# Altium footprint library Molex FFC - FPC Connectors (Through-Hole).PcbLib: 219 footprints (part 12 of 14)
Each footprint in its own frame and in the unit in brackets; x right, y up, seen from the top. Pads: shape width x height; smd on the part's side, far side on the other; paste and mask are expansions set on the pad; w line width, h text height; cw(c..) or ccw(c..) is an arc to the next point about the centre after c.
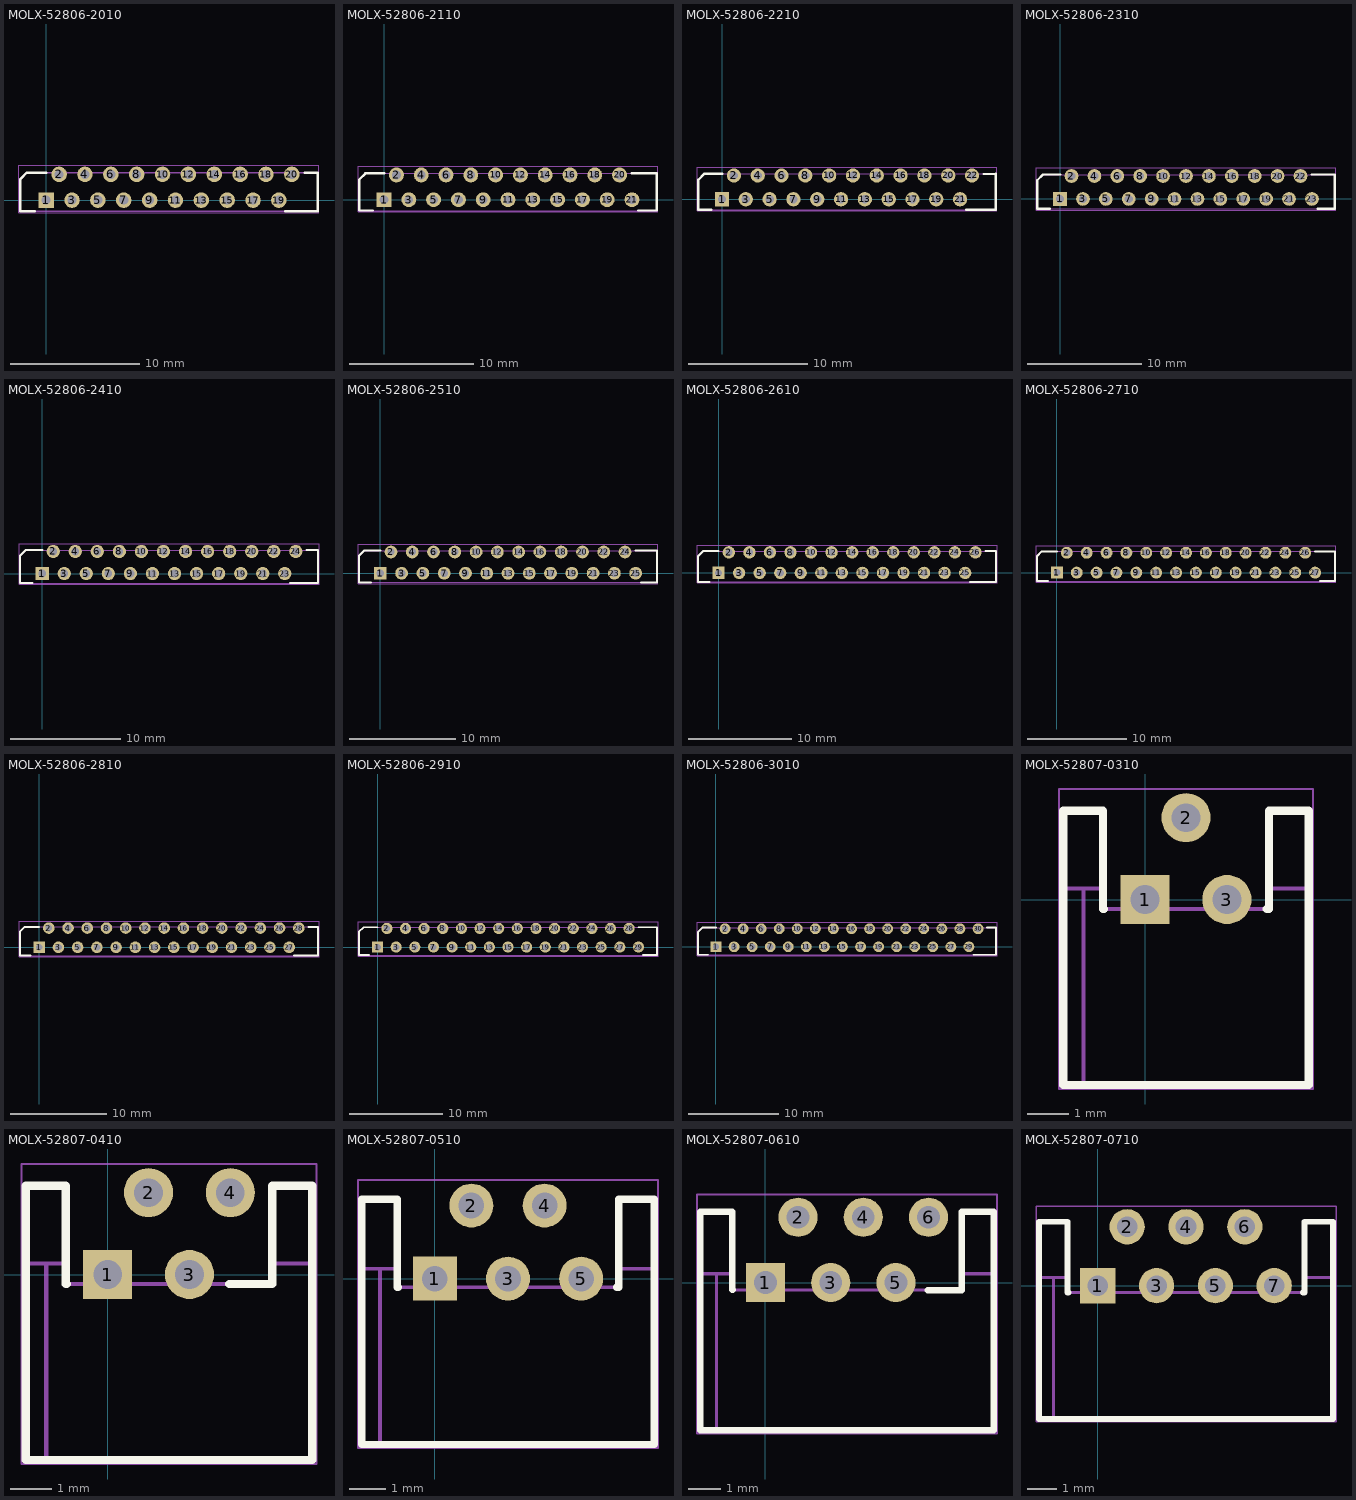
[diagram p11: the footprints below, top view; thin cyan lines are the x and y axes]

## MOLX-52806-2010 [mm] "FFC Connector, 20-Leads, Vertical, Pitch 1.0 mm, Mated Height 5.4 mm, Through Hole"
height 5.412
pads (20):
  rect 1.2x1.2 hole 0.7: 1(0,0)
  round 1.2 hole 0.7: 2(1,2) 3(2,0) 4(3,2) 5(4,0) 6(5,2) 7(6,0) 8(7,2) 9(8,0) 10(9,2) 11(10,0) 12(11,2) 13(12,0) 14(13,2) 15(14,0) 16(15,2) 17(16,0) 18(17,2) 19(18,0) 20(19,2)
Top Overlay:
  lines w0.2: -0.896,-0.87 -2,-0.87 -2,1.63 -1.5,2.13 0.008,2.13 ; 18.494,-0.87 21,-0.87 ; 19.992,2.13 21,2.13 21,-0.87
Mechanical 13:
  lines w0.1: -2,-0.87 -2,1.63 -1.5,2.13 21,2.13 21,-0.87 -2,-0.87
Mechanical 15:
  lines w0.05: -2.1,-0.97 21.1,-0.97 21.1,2.7 -2.1,2.7 -2.1,-0.97
3D body "52806-2010.stp": height 5.41, standoff -3.19, extent -2,-0.87 21,2.13

## MOLX-52806-2110 [mm] "FFC Connector, 21-Leads, Vertical, Pitch 1.0 mm, Mated Height 5.4 mm, Through Hole"
height 5.412
pads (21):
  rect 1.2x1.2 hole 0.7: 1(0,0)
  round 1.2 hole 0.7: 2(1,2) 3(2,0) 4(3,2) 5(4,0) 6(5,2) 7(6,0) 8(7,2) 9(8,0) 10(9,2) 11(10,0) 12(11,2) 13(12,0) 14(13,2) 15(14,0) 16(15,2) 17(16,0) 18(17,2) 19(18,0) 20(19,2) 21(20,0)
Top Overlay:
  lines w0.2: -0.896,-0.87 -2,-0.87 -2,1.63 -1.5,2.13 0.008,2.13 ; 19.992,2.13 22,2.13 22,-0.87 20.494,-0.87
Mechanical 13:
  lines w0.1: -2,-0.87 -2,1.63 -1.5,2.13 22,2.13 22,-0.87 -2,-0.87
Mechanical 15:
  lines w0.05: -2.1,-0.97 22.1,-0.97 22.1,2.7 -2.1,2.7 -2.1,-0.97
3D body "52806-2110.stp": height 5.41, standoff -3.19, extent -2,-0.87 22,2.13

## MOLX-52806-2210 [mm] "FFC Connector, 22-Leads, Vertical, Pitch 1.0 mm, Mated Height 5.4 mm, Through Hole"
height 5.412
pads (22):
  rect 1.2x1.2 hole 0.7: 1(0,0)
  round 1.2 hole 0.7: 2(1,2) 3(2,0) 4(3,2) 5(4,0) 6(5,2) 7(6,0) 8(7,2) 9(8,0) 10(9,2) 11(10,0) 12(11,2) 13(12,0) 14(13,2) 15(14,0) 16(15,2) 17(16,0) 18(17,2) 19(18,0) 20(19,2) 21(20,0) 22(21,2)
Top Overlay:
  lines w0.2: -0.896,-0.87 -2,-0.87 -2,1.63 -1.5,2.13 0.008,2.13 ; 20.494,-0.87 23,-0.87 23,2.13 21.992,2.13
Mechanical 13:
  lines w0.1: -2,-0.87 -2,1.63 -1.5,2.13 23,2.13 23,-0.87 -2,-0.87
Mechanical 15:
  lines w0.05: -2.1,-0.97 23.1,-0.97 23.1,2.7 -2.1,2.7 -2.1,-0.97
3D body "52806-2210.stp": height 5.41, standoff -3.19, extent -2,-0.87 23,2.13

## MOLX-52806-2310 [mm] "FFC Connector, 23-Leads, Vertical, Pitch 1.0 mm, Mated Height 5.4 mm, Through Hole"
height 5.412
pads (23):
  rect 1.2x1.2 hole 0.7: 1(0,0)
  round 1.2 hole 0.7: 2(1,2) 3(2,0) 4(3,2) 5(4,0) 6(5,2) 7(6,0) 8(7,2) 9(8,0) 10(9,2) 11(10,0) 12(11,2) 13(12,0) 14(13,2) 15(14,0) 16(15,2) 17(16,0) 18(17,2) 19(18,0) 20(19,2) 21(20,0) 22(21,2) 23(22,0)
Top Overlay:
  lines w0.2: -0.896,-0.87 -2,-0.87 -2,1.63 -1.5,2.13 0.008,2.13 ; 21.992,2.13 24,2.13 24,-0.87 22.494,-0.87
Mechanical 13:
  lines w0.1: -2,-0.87 -2,1.63 -1.5,2.13 24,2.13 24,-0.87 -2,-0.87
Mechanical 15:
  lines w0.05: -2.1,-0.97 24.1,-0.97 24.1,2.7 -2.1,2.7 -2.1,-0.97
3D body "52806-2310.stp": height 5.41, standoff -3.19, extent -2,-0.87 24,2.13

## MOLX-52806-2410 [mm] "FFC Connector, 24-Leads, Vertical, Pitch 1.0 mm, Mated Height 5.4 mm, Through Hole"
height 5.412
pads (24):
  rect 1.2x1.2 hole 0.7: 1(0,0)
  round 1.2 hole 0.7: 2(1,2) 3(2,0) 4(3,2) 5(4,0) 6(5,2) 7(6,0) 8(7,2) 9(8,0) 10(9,2) 11(10,0) 12(11,2) 13(12,0) 14(13,2) 15(14,0) 16(15,2) 17(16,0) 18(17,2) 19(18,0) 20(19,2) 21(20,0) 22(21,2) 23(22,0) 24(23,2)
Top Overlay:
  lines w0.2: -0.896,-0.87 -2,-0.87 -2,1.63 -1.5,2.13 0.008,2.13 ; 22.494,-0.87 25,-0.87 25,2.13 23.992,2.13
Mechanical 13:
  lines w0.1: -2,-0.87 25,-0.87 25,2.13 -1.5,2.13 -2,1.63 -2,-0.87
Mechanical 15:
  lines w0.05: -2.1,-0.97 -2.1,2.7 25.1,2.7 25.1,-0.97 -2.1,-0.97
3D body "52806-2410.stp": height 5.41, standoff -3.19, extent -2,-0.87 25,2.13

## MOLX-52806-2510 [mm] "FFC Connector, 25-Leads, Vertical, Pitch 1.0 mm, Mated Height 5.4 mm, Through Hole"
height 5.412
pads (25):
  rect 1.2x1.2 hole 0.7: 1(0,0)
  round 1.2 hole 0.7: 2(1,2) 3(2,0) 4(3,2) 5(4,0) 6(5,2) 7(6,0) 8(7,2) 9(8,0) 10(9,2) 11(10,0) 12(11,2) 13(12,0) 14(13,2) 15(14,0) 16(15,2) 17(16,0) 18(17,2) 19(18,0) 20(19,2) 21(20,0) 22(21,2) 23(22,0) 24(23,2) 25(24,0)
Top Overlay:
  lines w0.2: -0.896,-0.87 -2,-0.87 -2,1.63 -1.5,2.13 0.008,2.13 ; 23.992,2.13 26,2.13 26,-0.87 24.494,-0.87
Mechanical 13:
  lines w0.1: -2,-0.87 -2,1.63 -1.5,2.13 26,2.13 26,-0.87 -2,-0.87
Mechanical 15:
  lines w0.05: -2.1,-0.97 26.1,-0.97 26.1,2.7 -2.1,2.7 -2.1,-0.97
3D body "52806-2510.stp": height 5.41, standoff -3.19, extent -2,-0.87 26,2.13

## MOLX-52806-2610 [mm] "FFC Connector, 26-Leads, Vertical, Pitch 1.0 mm, Mated Height 5.4 mm, Through Hole"
height 5.412
pads (26):
  rect 1.2x1.2 hole 0.7: 1(0,0)
  round 1.2 hole 0.7: 2(1,2) 3(2,0) 4(3,2) 5(4,0) 6(5,2) 7(6,0) 8(7,2) 9(8,0) 10(9,2) 11(10,0) 12(11,2) 13(12,0) 14(13,2) 15(14,0) 16(15,2) 17(16,0) 18(17,2) 19(18,0) 20(19,2) 21(20,0) 22(21,2) 23(22,0) 24(23,2) 25(24,0) 26(25,2)
Top Overlay:
  lines w0.2: -0.896,-0.87 -2,-0.87 -2,1.63 -1.5,2.13 0.008,2.13 ; 24.494,-0.87 27,-0.87 27,2.13 25.992,2.13
Mechanical 13:
  lines w0.1: -2,-0.87 27,-0.87 27,2.13 -1.5,2.13 -2,1.63 -2,-0.87
Mechanical 15:
  lines w0.05: -2.1,-0.97 -2.1,2.7 27.1,2.7 27.1,-0.97 -2.1,-0.97
3D body "52806-2610.stp": height 5.41, standoff -3.19, extent -2,-0.87 27,2.13

## MOLX-52806-2710 [mm] "FFC Connector, 27-Leads, Vertical, Pitch 1.0 mm, Mated Height 5.4 mm, Through Hole"
height 5.412
pads (27):
  rect 1.2x1.2 hole 0.7: 1(0,0)
  round 1.2 hole 0.7: 2(1,2) 3(2,0) 4(3,2) 5(4,0) 6(5,2) 7(6,0) 8(7,2) 9(8,0) 10(9,2) 11(10,0) 12(11,2) 13(12,0) 14(13,2) 15(14,0) 16(15,2) 17(16,0) 18(17,2) 19(18,0) 20(19,2) 21(20,0) 22(21,2) 23(22,0) 24(23,2) 25(24,0) 26(25,2) 27(26,0)
Top Overlay:
  lines w0.2: -0.896,-0.87 -2,-0.87 -2,1.63 -1.5,2.13 0.008,2.13 ; 25.992,2.13 28,2.13 28,-0.87 26.494,-0.87
Mechanical 13:
  lines w0.1: -2,-0.87 28,-0.87 28,2.13 -1.5,2.13 -2,1.63 -2,-0.87
Mechanical 15:
  lines w0.05: -2.1,-0.97 -2.1,2.7 28.1,2.7 28.1,-0.97 -2.1,-0.97
3D body "52806-2710.stp": height 5.41, standoff -3.19, extent -2,-0.87 28,2.13

## MOLX-52806-2810 [mm] "FFC Connector, 28-Leads, Vertical, Pitch 1.0 mm, Mated Height 5.4 mm, Through Hole"
height 5.412
pads (28):
  rect 1.2x1.2 hole 0.7: 1(0,0)
  round 1.2 hole 0.7: 2(1,2) 3(2,0) 4(3,2) 5(4,0) 6(5,2) 7(6,0) 8(7,2) 9(8,0) 10(9,2) 11(10,0) 12(11,2) 13(12,0) 14(13,2) 15(14,0) 16(15,2) 17(16,0) 18(17,2) 19(18,0) 20(19,2) 21(20,0) 22(21,2) 23(22,0) 24(23,2) 25(24,0) 26(25,2) 27(26,0) 28(27,2)
Top Overlay:
  lines w0.2: -0.896,-0.87 -2,-0.87 -2,1.63 -1.5,2.13 0.008,2.13 ; 26.494,-0.87 29,-0.87 29,2.13 27.992,2.13
Mechanical 13:
  lines w0.1: -2,-0.87 -2,1.63 -1.5,2.13 29,2.13 29,-0.87 -2,-0.87
Mechanical 15:
  lines w0.05: -2.1,-0.97 29.1,-0.97 29.1,2.7 -2.1,2.7 -2.1,-0.97
3D body "52806-2810.stp": height 5.41, standoff -3.19, extent -2,-0.87 29,2.13

## MOLX-52806-2910 [mm] "FFC Connector, 29-Leads, Vertical, Pitch 1.0 mm, Mated Height 5.4 mm, Through Hole"
height 5.412
pads (29):
  rect 1.2x1.2 hole 0.7: 1(0,0)
  round 1.2 hole 0.7: 2(1,2) 3(2,0) 4(3,2) 5(4,0) 6(5,2) 7(6,0) 8(7,2) 9(8,0) 10(9,2) 11(10,0) 12(11,2) 13(12,0) 14(13,2) 15(14,0) 16(15,2) 17(16,0) 18(17,2) 19(18,0) 20(19,2) 21(20,0) 22(21,2) 23(22,0) 24(23,2) 25(24,0) 26(25,2) 27(26,0) 28(27,2) 29(28,0)
Top Overlay:
  lines w0.2: -0.896,-0.87 -2,-0.87 -2,1.63 -1.5,2.13 0.008,2.13 ; 27.992,2.13 30,2.13 30,-0.87 28.494,-0.87
Mechanical 13:
  lines w0.1: -2,-0.87 30,-0.87 30,2.13 -1.5,2.13 -2,1.63 -2,-0.87
Mechanical 15:
  lines w0.05: -2.1,-0.97 -2.1,2.7 30.1,2.7 30.1,-0.97 -2.1,-0.97
3D body "52806-2910.stp": height 5.41, standoff -3.19, extent -2,-0.87 30,2.13

## MOLX-52806-3010 [mm] "FFC Connector, 30-Leads, Vertical, Pitch 1.0 mm, Mated Height 5.4 mm, Through Hole"
height 5.412
pads (30):
  rect 1.2x1.2 hole 0.7: 1(0,0)
  round 1.2 hole 0.7: 2(1,2) 3(2,0) 4(3,2) 5(4,0) 6(5,2) 7(6,0) 8(7,2) 9(8,0) 10(9,2) 11(10,0) 12(11,2) 13(12,0) 14(13,2) 15(14,0) 16(15,2) 17(16,0) 18(17,2) 19(18,0) 20(19,2) 21(20,0) 22(21,2) 23(22,0) 24(23,2) 25(24,0) 26(25,2) 27(26,0) 28(27,2) 29(28,0) 30(29,2)
Top Overlay:
  lines w0.2: -0.896,-0.87 -2,-0.87 -2,1.63 -1.5,2.13 0.008,2.13 ; 28.494,-0.87 31,-0.87 ; 29.992,2.13 31,2.13 31,-0.87
Mechanical 13:
  lines w0.1: -2,-0.87 -2,1.63 -1.5,2.13 31,2.13 31,-0.87 -2,-0.87
Mechanical 15:
  lines w0.05: -2.1,-0.97 31.1,-0.97 31.1,2.7 -2.1,2.7 -2.1,-0.97
3D body "52806-3010.stp": height 5.41, standoff -3.19, extent -2,-0.87 31,2.13

## MOLX-52807-0310 [mm] "FFC Connector, 3-Leads, Right Angle, Pitch 1.0 mm, Mated Height 3.6 mm, Through Hole"
height 3.612
pads (3):
  rect 1.2x1.2 hole 0.7: 1(0,0)
  round 1.2 hole 0.7: 2(1,2) 3(2,0)
Top Overlay:
  lines w0.2: -1,-0.23 -1.025,-0.23 -1.025,2.17 -2,2.17 ; 2.973,-0.23 3.025,-0.23 3.025,2.17 4,2.17 4,-4.53 -2,-4.53 -2,2.17 ; -2,2.17 -2,2.17
Mechanical 13:
  lines w0.1: -2,0.27 -1.025,0.27 ; -1.5,-4.53 -1.5,0.27 ; 3.025,0.27 4,0.27 ; -2,-4.53 4,-4.53 4,2.17 3.025,2.17 3.025,-0.23 -1.025,-0.23 -1.025,2.17 -2,2.17 -2,-4.53
Mechanical 15:
  lines w0.05: -2.1,-4.63 4.1,-4.63 4.1,2.7 -2.1,2.7 -2.1,-4.63
3D body "52807-0310.stp": height 3.61, standoff -3.19, extent -2,-4.53 4,2.17

## MOLX-52807-0410 [mm] "FFC Connector, 4-Leads, Right Angle, Pitch 1.0 mm, Mated Height 3.6 mm, Through Hole"
height 3.612
pads (4):
  rect 1.2x1.2 hole 0.7: 1(0,0)
  round 1.2 hole 0.7: 2(1,2) 3(2,0) 4(3,2)
Top Overlay:
  lines w0.2: -1,-0.23 -1.025,-0.23 -1.025,2.17 -2,2.17 ; 2.973,-0.23 4.025,-0.23 4.025,2.17 5,2.17 5,-4.53 -2,-4.53 -2,2.17 ; -2,2.17 -2,2.17
Mechanical 13:
  lines w0.1: -2,0.27 -1.025,0.27 ; -1.5,-4.53 -1.5,0.27 ; 4.025,0.27 5,0.27 ; -2,-4.53 5,-4.53 5,2.17 4.025,2.17 4.025,-0.23 -1.025,-0.23 -1.025,2.17 -2,2.17 -2,-4.53
Mechanical 15:
  lines w0.05: -2.1,-4.63 5.1,-4.63 5.1,2.7 -2.1,2.7 -2.1,-4.63
3D body "52807-0410.stp": height 3.61, standoff -3.19, extent -2,-4.53 5,2.17

## MOLX-52807-0510 [mm] "FFC Connector, 5-Leads, Right Angle, Pitch 1.0 mm, Mated Height 3.6 mm, Through Hole"
height 3.612
pads (5):
  rect 1.2x1.2 hole 0.7: 1(0,0)
  round 1.2 hole 0.7: 2(1,2) 3(2,0) 4(3,2) 5(4,0)
Top Overlay:
  lines w0.2: -1,-0.23 -1.025,-0.23 -1.025,2.17 -2,2.17 ; 4.973,-0.23 5.025,-0.23 5.025,2.17 6,2.17 6,-4.53 -2,-4.53 -2,2.17 ; -2,2.17 -2,2.17
Mechanical 13:
  lines w0.1: -2,0.27 -1.025,0.27 ; -1.5,-4.53 -1.5,0.27 ; 5.025,0.27 6,0.27 ; -2,-4.53 -2,2.17 -1.025,2.17 -1.025,-0.23 5.025,-0.23 5.025,2.17 6,2.17 6,-4.53 -2,-4.53
Mechanical 15:
  lines w0.05: -2.1,-4.63 -2.1,2.7 6.1,2.7 6.1,-4.63 -2.1,-4.63
3D body "52807-0510.stp": height 3.61, standoff -3.19, extent -2,-4.53 6,2.17

## MOLX-52807-0610 [mm] "FFC Connector, 6-Leads, Right Angle, Pitch 1.0 mm, Mated Height 3.6 mm, Through Hole"
height 3.612
pads (6):
  rect 1.2x1.2 hole 0.7: 1(0,0)
  round 1.2 hole 0.7: 2(1,2) 3(2,0) 4(3,2) 5(4,0) 6(5,2)
Top Overlay:
  lines w0.2: -1,-0.225 -1.025,-0.225 -1.025,2.17 -2,2.17 ; 4.973,-0.23 6.025,-0.23 6.025,2.17 7,2.17 7,-4.53 -2,-4.53 -2,2.17 ; -2,2.17 -2,2.17
Mechanical 13:
  lines w0.1: -2,0.27 -1.025,0.27 ; -1.5,-4.53 -1.5,0.27 ; 6.025,0.27 7,0.27 ; -2,-4.53 7,-4.53 7,2.17 6.025,2.17 6.025,-0.23 -1.025,-0.23 -1.025,2.17 -2,2.17 -2,-4.53
Mechanical 15:
  lines w0.05: -2.1,-4.63 7.1,-4.63 7.1,2.7 -2.1,2.7 -2.1,-4.63
3D body "52807-0610.stp": height 3.61, standoff -3.19, extent -2,-4.53 7,2.17

## MOLX-52807-0710 [mm] "FFC Connector, 7-Leads, Right Angle, Pitch 1.0 mm, Mated Height 3.6 mm, Through Hole"
height 3.612
pads (7):
  rect 1.2x1.2 hole 0.7: 1(0,0)
  round 1.2 hole 0.7: 2(1,2) 3(2,0) 4(3,2) 5(4,0) 6(5,2) 7(6,0)
Top Overlay:
  lines w0.2: -1,-0.23 -1.025,-0.23 -1.025,2.17 -2,2.17 ; 6.973,-0.23 7.025,-0.23 7.025,2.17 8,2.17 8,-4.53 -2,-4.53 -2,2.17 ; -2,2.17 -2,2.17
Mechanical 13:
  lines w0.1: -2,0.27 -1.025,0.27 ; -1.5,-4.53 -1.5,0.27 ; 7.025,0.27 8,0.27 ; -2,-4.53 8,-4.53 8,2.17 7.025,2.17 7.025,-0.23 -1.025,-0.23 -1.025,2.17 -2,2.17 -2,-4.53
Mechanical 15:
  lines w0.05: -2.1,-4.63 8.1,-4.63 8.1,2.7 -2.1,2.7 -2.1,-4.63
3D body "52807-0710.stp": height 3.61, standoff -3.19, extent -2,-4.53 8,2.17